# Altium footprint library myPcbLib2.PcbLib: 56 footprints (part 3 of 4)
Each footprint in its own frame and in the unit in brackets; x right, y up, seen from the top. Pads: shape width x height; smd on the part's side, far side on the other; paste and mask are expansions set on the pad; w line width, h text height; cw(c..) or ccw(c..) is an arc to the next point about the centre after c.
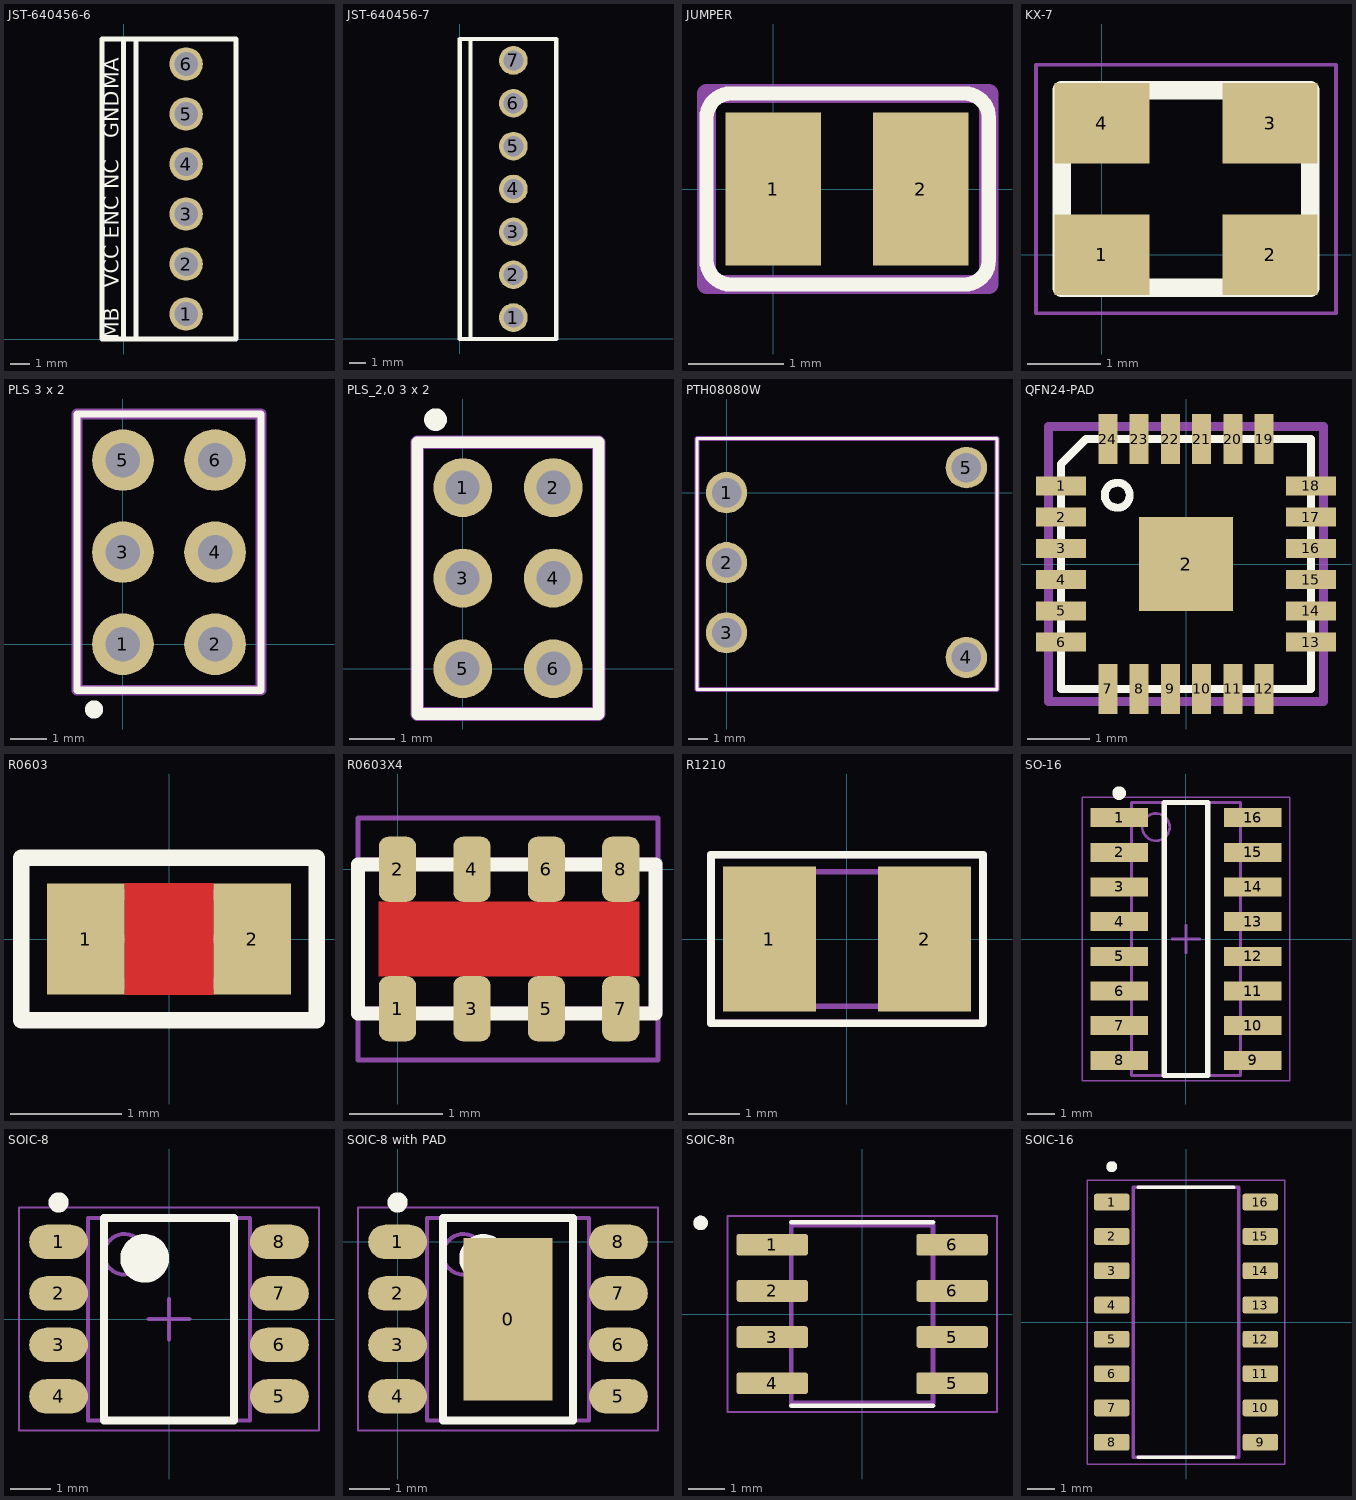
[diagram p2: the footprints below, top view; thin cyan lines are the x and y axes]

## JST-640456-6 [mm]
pads (6):
  round 1.7 hole 1.2: 1(3.18,1.27) 2(3.18,3.81) 3(3.18,6.35) 4(3.18,8.89) 5(3.18,11.43) 6(3.18,13.97)
Top Overlay:
  lines w0.254: 0.64,0 0.64,15.24 ; 1.6,0 1.7,0 ; 0,0 -1.1,0 -1.1,15.24 0,15.24 ; 0,0 0,15.24 ; 0,0 5.72,0 5.72,15.24 0,15.24 ; 0,0 0,15.24
  text "MB" at 0,0 h1.3
  text "VCC" at 0,2.6 h1.3
  text "ENC" at 0,5.1 h1.3
  text "GND" at 0,10.2 h1.3
  text "MA" at 0,12.7 h1.3
  text "NC" at 0,7.62 h1.3
Top Mechanical 9/Mechanical 10:
  text ".Comment" at 2.244,0.077 h1.52
  text ".Designator" at 1.084,0.077 h1.52
3D body "User Library-640456-4.step": height 10.03, standoff -3.56, extent -0.122,5.08 5.72,15.24
3D body "User Library-640456-4.step": height 10.03, standoff -3.56, extent -0.122,0 5.72,10.16

## JST-640456-7 [mm]
pads (7):
  round 1.7 hole 1.2: 1(3.18,1.27) 2(3.18,3.81) 3(3.18,6.35) 4(3.18,8.89) 5(3.18,11.43) 6(3.18,13.97) 7(3.18,16.51)
Top Overlay:
  lines w0.254: 0.64,0 0.64,17.78 ; 1.6,0 1.7,0 ; 0,0 0,17.78 5.72,17.78 5.72,0 0,0
Top Mechanical 9/Mechanical 10:
  text ".Comment" at -0.256,0.077 h1.52
  text ".Designator" at -1.416,0.077 h1.52
3D body "User Library-640456-4.step": height 10.03, standoff -3.56, extent -0.061,0 5.781,10.16
3D body "User Library-640456-4.step": height 10.03, standoff -3.56, extent -0.061,7.62 5.781,17.78

## JUMPER [mm]
pads (2):
  rect 1x1.6 smd: 1(0,0) 2(1.54,0)
Top Overlay:
  lines w0.15: -0.7,-0.746 ccw(c-0.446,-0.746) -0.446,-1 2,-1 ccw(c2,-0.746) 2.254,-0.746 2.254,0.746 ccw(c2,0.746) 2,1 -0.446,1 ccw(c-0.446,0.746) -0.7,0.746 -0.7,-0.746
Top Mechanical 9/Mechanical 10:
  text ".Comment" at -0.575,-0.575 h0.6
  text ".Designator" at -0.825,-0.025 h0.8
Mechanical 15:
  lines w0.2: -0.7,-1 2.254,-1 2.254,1 -0.7,1 -0.7,-1

## KX-7 [mm]
pads (4):
  rect 1.3x1.1 smd: 1(0,0) 2(2.3,0) 3(2.3,1.8) 4(0,1.8)
Top Overlay:
  lines w0.254: -0.55,-0.45 2.85,-0.45 2.85,2.25 -0.55,2.25 -0.55,-0.45
Top Mechanical 9/Mechanical 10:
  text ".Designator" at -1.023,3.716 h1.52
  text ".Comment" at -1.023,2.556 h1.52
Mechanical 15:
  lines w0.05: -0.9,-0.8 3.2,-0.8 3.2,2.6 -0.9,2.6 -0.9,-0.8
3D body "User Library-GeyerElectronics_KX7.step": height 0.81, standoff 0, extent -0.457,-0.35 2.757,2.15

## PLS 3 x 2 [mm] "2.54"
pads (6):
  round 1.7 hole 0.95: 1(0,0) 2(2.54,0) 3(0,2.54) 4(2.54,2.54) 5(0,5.08) 6(2.54,5.08)
Top Overlay:
  circle w0.25: c-0.8,-1.8 r0.125
  lines w0.2: -1.27,-1.27 3.81,-1.27 3.81,6.35 -1.27,6.35 -1.27,-1.27
Top Mechanical 9/Mechanical 10:
  text ".Comment" at -0.05,4.1 h0.6
  text ".Designator" at -0.05,3.35 h0.8
Mechanical 15:
  lines w0.3: -1.27,-1.27 3.81,-1.27 3.81,6.35 -1.27,6.35 -1.27,-1.27

## PLS_2,0 3 x 2 [mm] "2"
pads (6):
  round 1.3 hole 0.75: 1(0,4) 2(2,4) 3(0,2) 4(2,2) 5(0,0) 6(2,0)
Top Overlay:
  circle w0.25: c-0.6,5.5 r0.125
  lines w0.254: -1,-1 3,-1 3,5 -1,5 -1,-1
Top Mechanical 9/Mechanical 10:
  text ".Comment" at -0.05,4.1 h0.6
  text ".Designator" at -0.05,3.35 h0.8
Mechanical 15:
  lines w0.3: -1,-1 3,-1 3,5 -1,5 -1,-1

## PTH08080W [mm]
pads (5):
  round 2.1 hole 1.5 mask+0: 1(0,0) 2(0,-3.56) 3(0,-7.12) 4(12.19,-8.375) 5(12.19,1.275)
Top Overlay:
  lines w0.15: -1.5,-10 13.75,-10 13.75,2.75 -1.5,2.75 -1.5,-10
Top Mechanical 9/Mechanical 10:
  text ".Comment" at 7.75,-3.5 h0.6
  text ".Designator" at 7.75,-4.25 h0.8
Top Mechanical 11/Mechanical 12:
  lines w0.254: -1.5,-10 -1.5,2.75 13.75,2.75 13.75,-10 -1.5,-10
Mechanical 15:
  lines w0.05: -1.5,-10 13.75,-10 13.75,2.75 -1.5,2.75 -1.5,-10
3D body "PTH08080W.STEP": height 8.2, standoff -3.53, extent -1.59,-9.925 13.65,2.775

## QFN24-PAD [mm] "CP2104(Primary)"
pads (25):
  rect 0.8x0.3 smd: 1(-2,1.25) 2(-2,0.75) 3(-2,0.25) 4(-2,-0.25) 5(-2,-0.75) 6(-2,-1.25) 13(2,-1.25) 14(2,-0.75) 15(2,-0.25) 16(2,0.25) 17(2,0.75) 18(2,1.25)
  rect 1.5x1.5 smd: 2(0,0)
  rect 0.3x0.8 smd: 7(-1.25,-2) 8(-0.75,-2) 9(-0.25,-2) 10(0.25,-2) 11(0.75,-2) 12(1.25,-2) 19(1.25,2) 20(0.75,2) 21(0.25,2) 22(-0.25,2) 23(-0.75,2) 24(-1.25,2)
Top Overlay:
  circle w0.127: c-1.1,1.1 r0.2
  lines w0.127: -2,-2 -2,1.6 -1.6,2 2,2 2,-2 -2,-2
Top Component Outline:
  lines w0.15: -2.2,-2.2 2.2,-2.2 2.2,2.2 -2.2,2.2 -2.2,-2.2
Top Designator:
  text ".Designator" at -1.456,-0.508 h0.8
Top Mechanical 7/Mechanical 8:
  text ".Comment" at -1,-1.4 h0.6
3D body "User Library-QFN24_4x4x0_75_p0_5.STEP": height 0.75, standoff 0, extent -2.002,-2.002 2.002,2.002

## R0603 [mm]
height 0.45
pads (2):
  rect 0.7x1 smd: 1(-0.75,0) 2(0.75,0)
Top Layer:
  pour cut-out: -0.4,0.5 0.4,0.5 0.4,-0.5 -0.4,-0.5
Top Overlay:
  lines w0.15: -1.33,-0.73 1.33,-0.73 1.33,0.73 -1.33,0.73 -1.33,-0.73
Top Mechanical 9/Mechanical 10:
  text ".Designator" at -1.125,0.075 h0.8
  text ".Comment" at -0.9,-0.525 h0.6
Top Mechanical 11/Mechanical 12:
  lines w0.1: -0.85,-0.4 -0.85,0.4 0.75,0.4 0.75,-0.4 -0.85,-0.4
Mechanical 15:
  lines w0.05: -1.35,-0.75 -1.35,0.75 1.35,0.75 1.35,-0.75 -1.35,-0.75
  lines w0.1: -0.375,0 0.375,0 ; 0,-0.375 0,0.375
3D body "RESC1608.STEP": height 0.5, standoff 0, extent -0.85,-0.4 0.75,0.4

## R0603X4 [mm]
height 0.55
pads (8):
  rrect50% 0.4x0.7 smd: 1(0,-1.5) 2(0,0) 3(0.8,-1.5) 4(0.8,0) 5(1.6,-1.5) 6(1.6,0) 7(2.4,-1.5) 8(2.4,0)
Top Layer:
  pour cut-out: 2.6,-0.35 2.6,-1.15 -0.2,-1.15 -0.2,-0.35
Top Overlay:
  lines w0.15: -0.425,-1.55 -0.425,0.05 2.775,0.05 2.775,-1.55 -0.425,-1.55
Top Mechanical 9/Mechanical 10:
  text ".Designator" at -0.58,0.75 h0.8
  text ".Comment" at -0.56,-1.1 h0.6
Top Mechanical 11/Mechanical 12:
  lines w0.05: 0,-1.025 0,-0.925 ; 0,-0.575 0,-0.475 ; 0.8,-1.025 0.8,-0.925 ; 0.8,-0.575 0.8,-0.475 ; 1.6,-1.025 1.6,-0.925 ; 1.6,-0.575 1.6,-0.475 ; 2.425,-1.025 2.425,-0.925 ; 2.425,-0.575 2.425,-0.475 ; -0.1,-0.925 0.1,-0.925 0.1,-0.575 -0.1,-0.575 -0.1,-0.925 ; 0.7,-0.925 0.9,-0.925 0.9,-0.575 0.7,-0.575 0.7,-0.925 ; 1.5,-0.925 1.7,-0.925 1.7,-0.575 1.5,-0.575 1.5,-0.925 ; 2.325,-0.925 2.525,-0.925 2.525,-0.575 2.325,-0.575 2.325,-0.925
  lines w0.1: -0.4,-1.525 2.8,-1.525 2.8,0.075 -0.4,0.075 -0.4,-1.525
Mechanical 15:
  lines w0.05: -0.425,-2.05 -0.425,0.55 2.8,0.55 2.8,-2.05 -0.425,-2.05
3D body "R0603x4.STEP": height 0.5, standoff 0, extent -0.387,-1.512 2.813,0.088

## R1210 [mm]
height 0.55
pads (2):
  rect 1.8x2.8 smd: 1(-1.5,0) 2(1.5,0)
Top Overlay:
  lines w0.15: -2.63,-1.63 2.63,-1.63 2.63,1.63 -2.63,1.63 -2.63,-1.63
Top Component Outline:
  lines w0.1: -1.55,-1.3 1.55,-1.3 1.55,1.3 -1.55,1.3 -1.55,-1.3
Top Designator:
Top Mechanical 9/Mechanical 10:
  text ".Comment" at -2.423,-0.844 h1.52
  text ".Designator" at -2.423,0.316 h1.52
Mechanical 15:
  lines w0.15: -2.63,-1.63 2.63,-1.63 2.63,1.63 -2.63,1.63 -2.63,-1.63
3D body "User Library-R_1210.step": height 0.6, standoff 0, extent -1.6,-1.25 1.6,1.25

## SO-16 [mm] "ch340g"
height 1.75
pads (16):
  rect 2.1x0.7 smd: 1(-2.45,4.445) 2(-2.45,3.175) 3(-2.45,1.905) 4(-2.45,0.635) 5(-2.45,-0.635) 6(-2.45,-1.905) 7(-2.45,-3.175) 8(-2.45,-4.445) 9(2.45,-4.445) 10(2.45,-3.175) 11(2.45,-1.905) 12(2.45,-0.635) 13(2.45,0.635) 14(2.45,1.905) 15(2.45,3.175) 16(2.45,4.445)
Top Overlay:
  circle w0.25: c-2.45,5.345 r0.125
  lines w0.2: -0.8,-5 0.8,-5 0.8,5 -0.8,5 -0.8,-5
Top Mechanical 9/Mechanical 10:
  text ".Designator" at -0.9,5.92 h0.8
  text ".Comment" at -0.6,-6.2 h0.6
Top Mechanical 11/Mechanical 12:
  circle w0.1: c-1.1,4.1 r0.5
  lines w0.1: -0.5,0 0.5,0 ; 0,-0.5 0,0.5 ; -2,-5 2,-5 2,5 -2,5 -2,-5
Mechanical 15:
  lines w0.05: -3.8,-5.2 3.8,-5.2 3.8,5.2 -3.8,5.2 -3.8,-5.2
3D body "so16-1 (SOT109-1).STEP": height 1.78, standoff 0.01, extent -3.018,-4.985 3.118,4.985

## SOIC-8 [mm] "LMV358"
height 1.75
pads (8):
  oval 1.45x0.85 smd: 1(-2.725,1.905) 2(-2.725,0.635) 3(-2.725,-0.635) 4(-2.725,-1.905) 5(2.725,-1.905) 6(2.725,-0.635) 7(2.725,0.635) 8(2.725,1.905)
Top Overlay:
  circle w0.25: c-2.725,2.88 r0.125
  circle w0.6: c-0.6,1.5 r0.3
  lines w0.2: -1.6,-2.5 -1.6,2.5 1.6,2.5 1.6,-2.5 -1.6,-2.5
Top Mechanical 9/Mechanical 10:
  text ".Designator" at -2.198,4.016 h1.52
  text ".Comment" at -2.198,2.856 h1.52
Top Mechanical 13/Mechanical 14:
  circle w0.1: c-1.1,1.6 r0.5
  lines w0.1: -2,-2.5 -2,2.5 2,2.5 2,-2.5 -2,-2.5
Mechanical 15:
  lines w0.05: -3.7,-2.75 -3.7,2.75 3.7,2.75 3.7,-2.75 -3.7,-2.75
  lines w0.1: -0.5,0 0.5,0 ; 0,-0.5 0,0.5
3D body "User Library-SOIC-8-1.step": height 1.75, standoff 0, extent -3,-2.45 3,2.45

## SOIC-8 with PAD [mm]
pads (9):
  rect 2.2x4 smd: 0(2.725,-1.905)
  oval 1.45x0.85 smd: 1(0,0) 2(0,-1.27) 3(0,-2.54) 4(0,-3.81) 5(5.45,-3.81) 6(5.45,-2.54) 7(5.45,-1.27) 8(5.45,0)
Top Overlay:
  circle w0.25: c0,0.975 r0.125
  circle w0.6: c2.125,-0.405 r0.3
  lines w0.2: 1.125,-4.405 1.125,0.595 4.325,0.595 4.325,-4.405 1.125,-4.405
Top Mechanical 9/Mechanical 10:
  text ".Designator" at 0.527,2.111 h1.52
  text ".Comment" at 0.527,0.951 h1.52
Top Mechanical 13/Mechanical 14:
  circle w0.1: c1.625,-0.305 r0.5
  lines w0.1: 0.725,-4.405 0.725,0.595 4.725,0.595 4.725,-4.405 0.725,-4.405
Mechanical 15:
  lines w0.05: -0.975,-4.655 -0.975,0.845 6.425,0.845 6.425,-4.655 -0.975,-4.655
  lines w0.1: 2.225,-1.905 3.225,-1.905 ; 2.725,-2.405 2.725,-1.405
3D body "User Library-SOIC-8-1.step": height 1.75, standoff 0, extent -0.275,-4.355 5.725,0.545

## SOIC-8n [mm]
pads (8):
  rrect25% 1.97x0.6 smd: 1(-2.475,1.905) 2(-2.475,0.635) 3(-2.475,-0.635) 4(-2.475,-1.905) 5(2.475,-1.905) 5(2.475,-0.635) 6(2.475,0.635) 6(2.475,1.905)
Top Overlay:
  circle w0.2: c-4.445,2.505 r0.1
  lines w0.127: -1.95,-2.525 1.95,-2.525 ; -1.95,2.525 1.95,2.525
Top Mechanical 9/Mechanical 10:
  text ".Designator" at -2.323,3.816 h1.52
  text ".Comment" at -2.323,2.656 h1.52
Top Mechanical 13/Mechanical 14:
  circle w0.2: c-4.445,2.505 r0.1
  lines w0.127: -1.95,-2.45 -1.95,2.45 1.95,2.45 1.95,-2.45 -1.95,-2.45
Mechanical 15:
  lines w0.05: -3.71,-2.7 -3.71,2.7 3.71,2.7 3.71,-2.7 -3.71,-2.7
3D body "step_temp.STEP": height 3.63, standoff 0, extent -2.97,-2.44 2.97,2.44

## SOIC-16 [mm]
pads (16):
  rrect25% 1.31x0.62 smd: 1(-2.75,4.445) 2(-2.75,3.175) 3(-2.75,1.905) 4(-2.75,0.635) 5(-2.75,-0.635) 6(-2.75,-1.905) 7(-2.75,-3.175) 8(-2.75,-4.445) 9(2.75,-4.445) 10(2.75,-3.175) 11(2.75,-1.905) 12(2.75,-0.635) 13(2.75,0.635) 14(2.75,1.905) 15(2.75,3.175) 16(2.75,4.445)
Top Overlay:
  circle w0.2: c-2.75,5.755 r0.1
  lines w0.127: -1.775,-5 1.775,-5 ; -1.775,5 1.775,5
Top Mechanical 9/Mechanical 10:
  text ".Comment" at -2.523,2.656 h1.52
  text ".Designator" at -2.523,3.816 h1.52
Top Mechanical 13/Mechanical 14:
  circle w0.2: c-2.75,5.755 r0.1
  lines w0.127: -1.95,-5 1.95,-5 1.95,5 -1.95,5 -1.95,-5
Mechanical 15:
  lines w0.05: -3.655,-5.25 3.655,-5.25 3.655,5.25 -3.655,5.25 -3.655,-5.25
3D body "step_temp.STEP": height 1.8, standoff 0, extent -3,-5 3,5